# Altium footprint library chenjd.PcbLib: 87 footprints (part 6 of 6)
Each footprint in its own frame and in the unit in brackets; x right, y up, seen from the top. Pads: shape width x height; smd on the part's side, far side on the other; paste and mask are expansions set on the pad; w line width, h text height; cw(c..) or ccw(c..) is an arc to the next point about the centre after c.
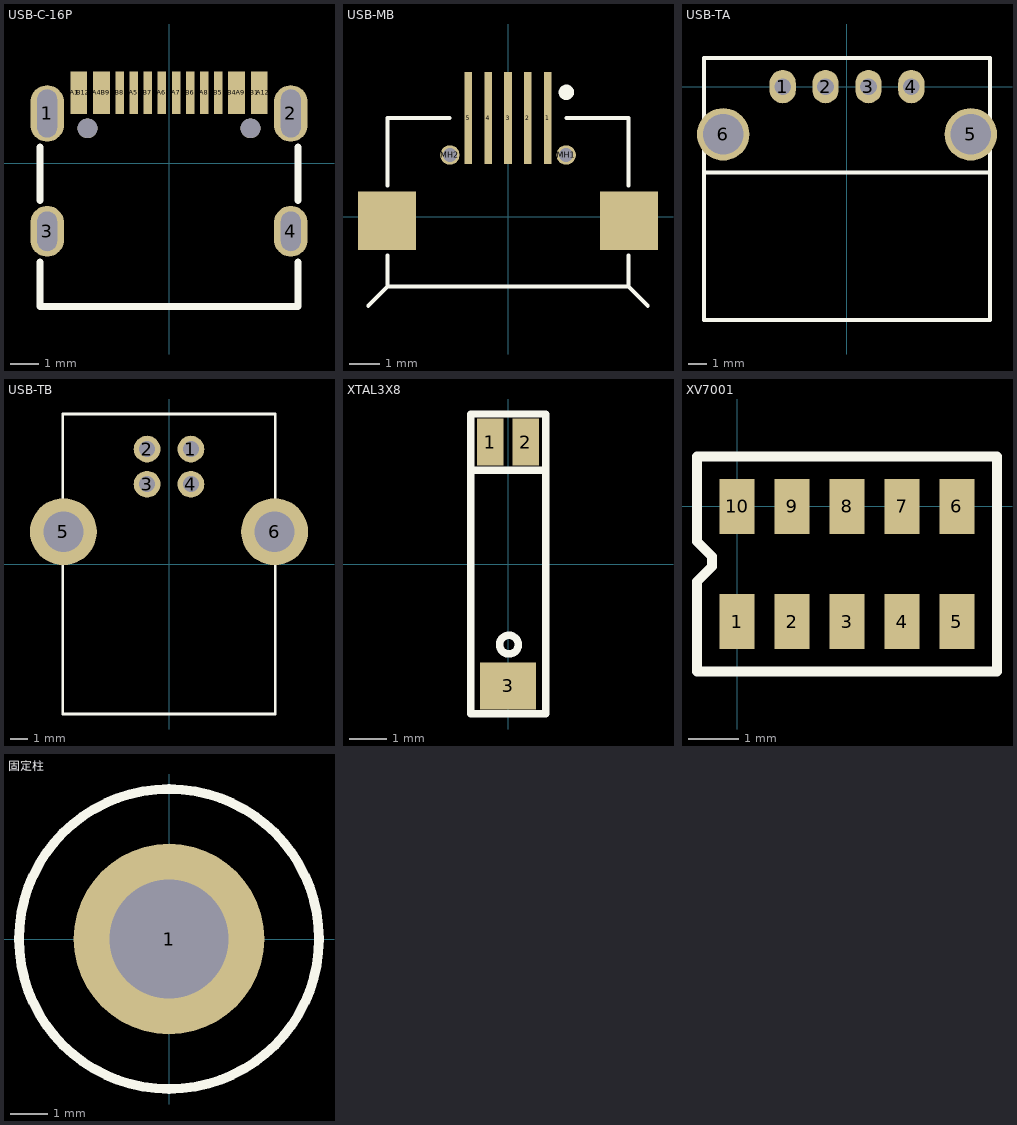
[diagram p5: the footprints below, top view; thin cyan lines are the x and y axes]

## USB-C-16P [mm] "USB Type-c 16P"
pads (22):
  oval 1.2x2 hole 0.7 slot 1.7 at 90 deg: 1(-4.32,1.765) 2(4.32,1.765)
  oval 1.2x1.8 hole 0.7 slot 1.4 at 90 deg: 3(-4.32,-2.415) 4(4.32,-2.415)
  rect 0.3x1.5 smd: A1(-3.35,2.5) A4(-2.55,2.5) A5(-1.25,2.5) A6(-0.25,2.5) A7(0.25,2.5) A8(1.25,2.5) A9(2.55,2.5) A12(3.35,2.5) B1(3.05,2.5) B4(2.25,2.5) B5(1.75,2.5) B6(0.75,2.5) B7(-0.75,2.5) B8(-1.75,2.5) B9(-2.25,2.5) B12(-3.05,2.5)
  round 0.7 hole 0.7 unplated: ""(-2.89,1.235) ""(2.89,1.235)
Top Overlay:
  lines w0.254: -4.572,-3.507 -4.572,-5.08 4.572,-5.08 4.572,-3.507 ; -4.572,-1.323 -4.572,0.573 ; 4.572,-1.323 4.572,0.573
3D body "1.step": height 3.26, standoff -1, extent -4.475,-4.956 4.475,2.794

## USB-MB [mm] "USB2.0-Mirco-B"
pads (9):
  rect 0.25x3 smd: 1(1.3,3.222) 2(0.65,3.222) 3(0,3.222) 4(-0.65,3.222) 5(-1.3,3.222)
  round 0.635 hole 0.457 unplated: MH1(1.9,2.014) MH2(-1.9,2.014)
  rect 1.9x1.9 smd: ""(-3.95,-0.136) ""(3.95,-0.136)
Top Overlay:
  circle w0.25: c1.905,4.062 r0.125
  lines w0.127: -4.567,-2.916 -3.937,-2.286 -3.937,-1.27 ; -3.937,1.016 -3.937,3.222 ; -3.9,-2.286 3.9,-2.286 ; -3.9,3.222 -1.905,3.222 ; 1.905,3.222 3.9,3.222 ; 3.937,-1.27 3.937,-2.286 4.567,-2.916 ; 3.937,1.016 3.937,3.222
3D body "micorusb.STEP": height 2.78, standoff -0.53, extent -4.1,-2.526 4.1,2.904

## USB-TA [mil] "USB2.0 Type-A接口"
pads (6):
  oval 55x70 hole 35: 1(-134.51,0.1) 2(-44.51,0.1) 3(45.49,0.1) 4(135.49,0.1)
  round 110 hole 85: 5(260.49,-100.15) 6(-259.51,-100.15)
Top Overlay:
  lines w8: -299.51,-180.15 300.49,-180.15 ; -299.51,-489.89 300.49,-489.89 300.49,60.1 -299.51,60.1 -299.51,0.1 -299.51,-489.89
3D body "USB.STEP": height 273.62, standoff -165.35, extent -311.02,-499.37 311.03,40

## USB-TB [mil] "USB2.0 Type-B接口"
pads (6):
  round 60 hole 36: 1(49.21,257.87) 2(-49.22,257.87) 3(-49.22,179.13) 4(49.21,179.13)
  round 150 hole 90: 5(-237.01,72.44) 6(237.01,72.44)
Top Overlay:
  lines w6: -238.19,-2.54 -238.19,-336.61 238.19,-336.61 238.19,-2.54 ; -238.19,147.44 -238.19,336.62 238.19,336.62 238.19,147.44
3D body "User Library-Samtec - USB-B-S-X-W-TH.STEP": height 433.07, standoff -143.42, extent -292.54,-315 290,334.61

## XTAL3X8 [mil] "RTC晶振"
pads (3):
  rect 28x50 smd: 1(-19,130) 2(19,130)
  rect 60x50 smd: 3(0,-130)
Top Overlay:
  circle w8: c1,-86 r10
  lines w8: -40,100 40,100 ; -40,-160 40,-160 40,160 -40,160 -40,-160
3D body "RTC晶振.STEP": height 39.37, standoff 0, extent -30,-147.64 29.06,147.64

## XV7001 [mm] "爱普生陀螺仪"
height 1.016
pads (10):
  rect 0.7x1.1 smd: 1(0,-2.3) 2(1.1,-2.3) 3(2.2,-2.3) 4(3.3,-2.3) 5(4.4,-2.3) 6(4.4,0) 7(3.3,0) 8(2.2,0) 9(1.1,0) 10(0,0)
Top Overlay:
  lines w0.203: -0.8,-3.3 -0.8,-1.5 -0.5,-1.2 -0.5,-1 -0.8,-0.7 -0.8,1 5.2,1 5.2,-3.3 -0.8,-3.3

## 固定柱 [mm] "固定柱"
pads (1):
  round 5.08 hole 3.175: 1(0,0)
Top Overlay:
  circle w0.254: c0,0 r4
3D body "M3x10.STEP": height 10.05, standoff 0.05, extent -2.698,-2.35 2.698,2.35